# Altium integrated library General.IntLib: 14 symbols
Pins are listed as number, name and electrical type; pins without a type are passive.

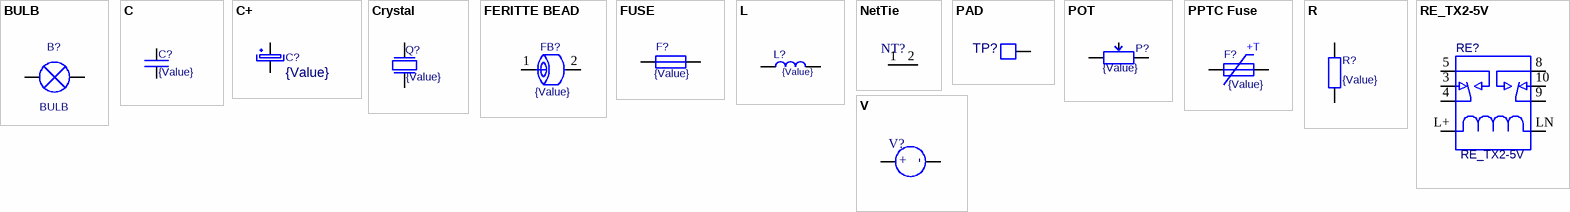
[diagram p0: symbols BULB to V]

## BULB
designator B?
Value: *
pins: 1, 2

## C
designator C?, comment {Value}
Capacitor; Value: {Value}
footprint C0805
footprint C1206
footprint C square R15 (600mil)
footprint C Square R5.08 (200mil)
footprint RCL1210
footprint C0603 (Chip Capacitor, 2-Leads, Body 1,60x0,81mm, IPC Medium Density)
footprint C ceramic F5mm
pins: 1, 2

## C+
designator C?, comment {Value}
Capacitor Polarized; Value: {Value}
footprint C Tantal A (Molded Capacitor, 2-Leads, Body 3,2x1,6mm, IPC Medium Density)
footprint C Tantal B (Molded Capacitor, 2-Leads, Body 3,5x2,8mm, IPC Medium Density)
footprint C Tantal C (Molded Capacitor, 2-Leads, Body 6,0x3,2mm, IPC Medium Density)
footprint C Tantal D (Molded Capacitor, 2-Leads, Body 7,3x4,3mm, IPC Medium Density)
footprint C Tantal E (Molded Capacitor, 2-Leads, Body 7,3x4,3mm, IPC Medium Density)
footprint C_R_5.0_10.0x13.0 (Capacitor radial FI=10mm Height=13mm, Pitch=5mm)
footprint C AlElko 5x11 R2
footprint C AlElko 6x__ R2.5
footprint C-SMD-ELKO-B (Aluminum Electrolytic Capacitor, Body 4.20x4.20x6.10mm, IPC Medium Density)
footprint C-SMD-ELKO-C (Aluminum Electrolytic Capacitor, Body 5.30x5.30x6.10mm, IPC Medium Density)
footprint C-SMD-ELKO-D (Aluminum Electrolytic Capacitor, Body 6.60x6.60x6.10mm, IPC Medium Density)
footprint C-SMD-ELKO-D8 (Aluminum Electrolytic Capacitor, Body 6,60x6,60x8,00mm, IPC Medium Density)
footprint C-SMD-ELKO-F (Aluminum Electrolytic Capacitor, Body 8.30x8.30x10.50mm, IPC Medium Density)
footprint C-SMD-ELKO-G (Aluminum Electrolytic Capacitor, Body 10.30x10.30x10.50mm, IPC Medium Density)
footprint C AlElko 8x__ R3.5
footprint C AlElko 10x__ R5
footprint C AlElko R2.5,R5
footprint C AlElko R2.54 FI5
pins: 1, 2

## Crystal
designator Q?, comment {Value}
Crystal; Value: {Value}
footprint Crystal_HC49 (Crystall SMD short HC49)
footprint Crystal_THT_small_lying_down
footprint Crystal_THT_short (Crystal short THT)
footprint Crystal_THT_tall (Crystal tall THT)
footprint Crystal_5x3.2mm
pins: 1, 2

## FERITTE BEAD
designator FB?, comment {Value}
FERITTE BEAD; Value: {Value}
footprint R0805
footprint R1206
pins: 1, 2

## FUSE
designator F?, comment {Value}
FUSE; Value: {Value}
footprint R0805
footprint R1206
pins: 1, 2

## L
designator L?, comment {Value}
L; Value: {Value}
footprint R400
footprint R0805
footprint L_10.4X10.4
footprint L_Radial_5.0_1.0_3D_FI11.5_H14
footprint L_Radial_7.5_1.2_2D_FI16
footprint L_RADIAL_5.0_8.5x11.0
footprint L_RADIAL_7.2_13.7x15.9
footprint L_P3030X10N (Precision Wire Wound Inductor, 2-Leads, Body 3.00x3.00mm, IPC Medium Density)
footprint L_2020(5050) (Precision Wire Wound Inductor, 2-Leads, Body 5,00x5,00mm, IPC Medium Density)
footprint L_2523(7070)
footprint R1206
footprint RCL1210
footprint MSS1278 (Precision Wire Wound Inductor, 2-Leads, Body 12,15x12,15mm, IPC Medium Density)
footprint MSS1278-enlarged pads (Precision Wire Wound Inductor, 2-Leads, Body 12,15x12,15mm, IPC NONE - Medium->Enlarged pads)
footprint L-Coilcraft-DR0608
footprint L Murata 1400 F23.8mm 27x14
pins: 1, 2

## NetTie
designator NT?  (value not drawn)  (net tie, no BOM)
Connetct different grounds together
footprint NetTie-10mil
footprint NETTIE-5mil
footprint NETTIE-7mil
footprint NETTIE-20mil
footprint NETTIE-25mil
footprint NETTIE-50mil
pins: 1, 2

## PAD
designator TP?  (value not drawn)
Value: *
footprint PAD
footprint PAD_CIRC
footprint PAD_HOLE
footprint PAD_CIRC_HOLE
pins: 1

## POT
designator P?, comment {Value}
POTENTIOMETER; Value: {Value}
footprint POT-ROT
footprint POT-H-multi
footprint POT-H-10
footprint POT-H-2.5
footprint POT-H-5
footprint P_2020 (2x2mm SMD trimmer)
pins: 1, 2, 3

## PPTC Fuse
designator F?, comment {Value}
PPTC Fuse; Value: {Value}
footprint PPTC SMD 7.37x5.12 (PPTC SMD, 2-Leads, Body 7.36x5.12mm, IPC Medium Density)
footprint PPTC SMD 4.55x3.24 (1812) (PPTC SMD, 2-Leads, Body 4.55x3.24mm, IPC Medium Density)
pins: 1, 2
text: +T

## R
designator R?, comment {Value}
R; Value: {Value}
footprint R0805
footprint R1206
footprint R400
footprint R300
footprint R500
footprint R0603 (Chip Resistor, 2-Leads, Body 1,55x0,85mm, IPC Medium Density)
pins: 1, 2

## RE_TX2-5V
designator RE?
Value: {Value}
footprint _DIP12_MOD_RE_TX2-5V(Primary)
pins: 3 M1, 4 C1, 5 P1, 8 P2, 9 C2, 10 M2, L+, LN L-

## V
designator V?
simulation model Model Name (Model Description)
pins: 1, 2
text: -; +